# Altium footprint library BMS_Slave.PcbLib: 58 footprints (part 3 of 4)
Each footprint in its own frame and in the unit in brackets; x right, y up, seen from the top. Pads: shape width x height; smd on the part's side, far side on the other; paste and mask are expansions set on the pad; w line width, h text height; cw(c..) or ccw(c..) is an arc to the next point about the centre after c.
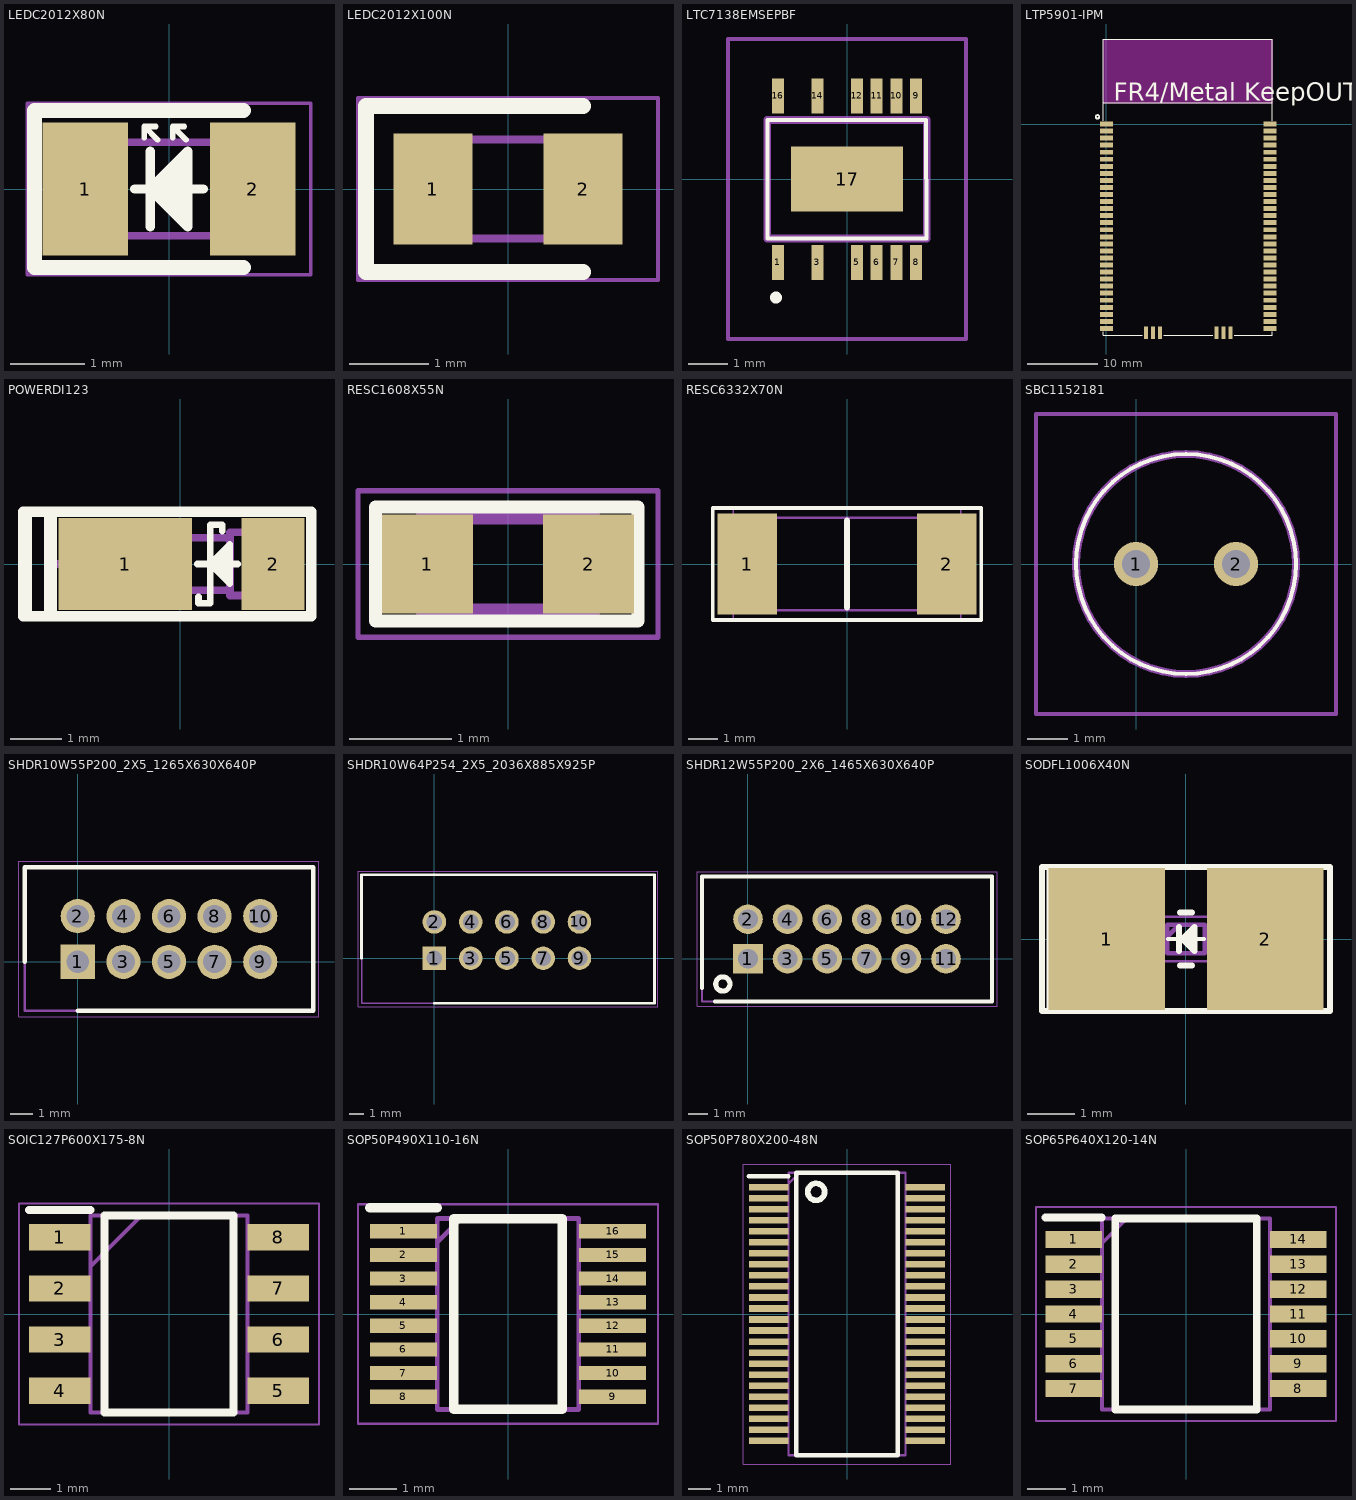
[diagram p2: the footprints below, top view; thin cyan lines are the x and y axes]

## LEDC2012X80N [mil]
pads (2):
  rect 45x70 smd: 1(-44.15,0) 2(44.15,0)
Top Overlay:
  region: -10,0 10,20 10,-20
  lines w3: -13,27 -13,33 ; -7,33 -13,33 ; -6,26 -13,33 ; 2,27 2,33 ; 8,33 2,33 ; 9,26 2,33
  lines w5: -18,0 -10,0 ; -10,-20 -10,20 ; 10,0 18,0 ; -10,0 10,20 10,-20 -10,0
  lines w7.87: 39.37,-41.34 -70.87,-41.34 -70.87,41.34 39.37,41.34
Mechanical 13:
  lines w3.94: -39.37,8.19 -22.95,24.61 ; -39.37,-24.61 39.37,-24.61 39.37,24.61 -39.37,24.61 -39.37,-24.61
Mechanical 15:
  lines w1.97: -74.8,-45.28 74.8,-45.28 74.8,45.28 -74.8,45.28 -74.8,-45.28
3D body "SML-210VTT86.stp": height 31.5, standoff 0, extent -39.37,-24.61 39.37,24.61

## LEDC2012X100N [mm]
pads (2):
  rect 1x1.4 smd: 1(-0.95,0) 2(0.95,0)
Top Overlay:
  lines w0.2: 0.95,-1.05 -1.8,-1.05 -1.8,1.05 0.95,1.05
Mechanical 13:
  lines w0.1: -1,0.208 -0.583,0.625 ; -1,-0.625 -1,0.625 1,0.625 1,-0.625 -1,-0.625
Mechanical 15:
  lines w0.05: -1.9,-1.15 -1.9,1.15 1.9,1.15 1.9,-1.15 -1.9,-1.15

## LTC7138EMSEPBF [mm]
pads (13):
  rect 0.305x0.889 smd: 1(-1.75,-2.107) 3(-0.75,-2.107) 5(0.25,-2.107) 6(0.75,-2.107) 7(1.25,-2.107) 8(1.75,-2.107) 9(1.75,2.107) 10(1.25,2.107) 11(0.75,2.107) 12(0.25,2.107) 14(-0.75,2.107) 16(-1.75,2.107)
  rect 2.845x1.651 smd: 17(0,0)
Top Overlay:
  lines w0.102: -2.02,-1.5 -2.02,1.5 2,1.5 2.02,-1.5 -2.02,-1.5
  lines w0.2: -1.85,-3 cw(c-1.8,-3) -1.75,-3 cw(c-1.8,-3) -1.85,-3
Mechanical 13:
  lines w0.2: -2.02,-1.5 2.02,-1.5 2.02,1.5 -2.02,1.5 -2.02,-1.5
Mechanical 15:
  lines w0.1: -3.02,-4.05 3.02,-4.05 3.02,3.551 -3.02,3.551 -3.02,-4.05
3D body "LTC7138IMSE#PBF.STEP": height 1.1, standoff 0, extent -2.019,-2.45 2.02,2.45

## LTP5901-IPM [mm] "Chip Antenna"
pads (66):
  rect 1.8x0.7 smd mask+0.05: 1(0,0) 2(0,-1) 3(0,-2) 4(0,-3) 5(0,-4) 6(0,-5) 7(0,-6) 8(0,-7) 9(0,-8) 10(0,-9) 11(0,-10) 12(0,-11) 13(0,-12) 14(0,-13) 15(0,-14) 16(0,-15) 17(0,-16) 18(0,-17) 19(0,-18) 20(0,-19) 21(0,-20) 22(0,-21) 23(0,-22) 24(0,-23) 25(0,-24) 26(0,-25) 27(0,-26) 28(0,-27) 29(0,-28) 30(0,-29) 37(23.2,-29) 38(23.2,-28) 39(23.2,-27) 40(23.2,-26) 41(23.2,-25) 42(23.2,-24) 43(23.2,-23) 44(23.2,-22) 45(23.2,-21) 46(23.2,-20) 47(23.2,-19) 48(23.2,-18) 49(23.2,-17) 50(23.2,-16) 51(23.2,-15) 52(23.2,-14) 53(23.2,-13) 54(23.2,-12) 55(23.2,-11) 56(23.2,-10) 57(23.2,-9) 58(23.2,-8) 59(23.2,-7) 60(23.2,-6) 61(23.2,-5) 62(23.2,-4) 63(23.2,-3) 64(23.2,-2) 65(23.2,-1) 66(23.2,0)
  rect 0.6x1.8 smd mask+0.05: 31(5.6,-29.6) 32(6.6,-29.6) 33(7.6,-29.6) 34(15.6,-29.6) 35(16.6,-29.6) 36(17.6,-29.6)
Top Overlay:
  circle w0.254: c-1.27,1.016 r0.254
  lines w0.127: -0.451,-29.5 -0.451,-30 5.1,-30 ; -0.451,0.5 -0.451,12 23.549,12 23.549,0.5 ; -0.451,3 23.549,3 ; 8.1,-30 15.1,-30 ; 18.1,-29.997 23.549,-29.997 23.549,-29.497
  text "FR4/Metal KeepOUT" at 1.016,3.302 h2.54
Keep-Out Layer:
  rectangle: -0.508,2.921 23.622,12.065
3D body "LTP5901_061-0167.STEP": height 3.68, standoff 0.01, extent -0.451,-30 23.549,12

## POWERDI123 [mil]
pads (2):
  rect 102x70 smd: 1(-42,0)
  rect 48x70 smd: 2(71,0)
Top Overlay:
  rectangle: -104,-40 -94,40
  rectangle: -123,-40 -113,40
  region: 38,15 23,0 38,-15
  lines w5: 13,0 23,0 ; 14,-25 14,-30 23,-30 23,30 32,30 32,25 ; 34,0 44,0 ; 23,0 38,-15 38,15 23,0
  lines w7.87: -120,-40 -120,40 100,40 100,-40 -120,-40
Mechanical 13:
  lines w6: -99,0 -69,0 ; -84,-15 -84,15 ; -28,-20 -38,-10 ; -28,20 -38,10 ; -38,-20 -38,-24 -77,-24 -77,24 -38,24 -38,20 ; -38,-20 -38,-10 ; -38,-20 38,-20 ; -38,-10 -38,10 ; -38,-10 -38,10 ; -38,10 -38,20 ; -38,20 38,20 ; 38,-20 38,-24 77,-24 77,25 38,24 38,20 ; 38,-20 38,20
3D body: height 45.28, standoff 0, extent 0,0 0,0
3D body: height 39.37, standoff 0, extent -77,-39 77,39

## RESC1608X55N [mil]
pads (2):
  rect 35x38 smd: 1(-31,0) 2(31,0)
Top Overlay:
  lines w5: -51,-22 -51,22 50,22 50,-22 -51,-22
Mechanical 13:
  lines w5: -33.46,-17.72 -33.46,17.72 33.46,17.72 33.46,-17.72 -33.46,-17.72
Mechanical 15:
  lines w1.97: -57.68,-28.15 -57.68,28.15 57.68,28.15 57.68,-28.15 -57.68,-28.15
3D body "CRCW060310K0FKEAC.STEP": height 21.65, standoff 0, extent -31.49,-15.74 31.5,15.75

## RESC6332X70N [mil]
pads (2):
  rect 80x135 smd: 1(-133.5,0) 2(133.5,0)
Top Overlay:
  lines w5: -180,-75 180,-75 180,75 -180,75 -180,-75
  lines w7.87: 0,-58.07 0,58.07
Mechanical 13:
  lines w3.94: -124.02,-62.01 -124.02,62.01 124.02,62.01 124.02,-62.01 -124.02,-62.01
Mechanical 15:
  lines w1.97: -152.56,-76.77 -152.56,76.77 152.56,76.77 152.56,-76.77 -152.56,-76.77
3D body "CRCW251233R0FKEG.stp": height 27.56, standoff 0, extent -124.02,-62.01 124.02,62.01

## SBC1152181 [mm]
pads (2):
  round 1.1 hole 0.7: 1(0,0) 2(2.5,0)
Top Overlay:
  lines w0.1: -1.5,0 ccw(c1.25,0) 4,0 ccw(c1.25,0) -1.5,0
Mechanical 13:
  lines w0.2: -1.5,0 ccw(c1.25,0) 4,0 ccw(c1.25,0) -1.5,0
Mechanical 15:
  lines w0.1: -2.5,-3.75 -2.5,3.75 5,3.75 5,-3.75 -2.5,-3.75

## SHDR10W55P200_2X5_1265X630X640P [mm]
pads (10):
  rect 1.5x1.5 hole 1: 1(0,0)
  round 1.5 hole 1: 2(0,2) 3(2,0) 4(2,2) 5(4,0) 6(4,2) 7(6,0) 8(6,2) 9(8,0) 10(8,2)
Top Overlay:
  lines w0.2: -2.325,0 -2.325,4.15 10.325,4.15 10.325,-2.15 0,-2.15
Mechanical 13:
  lines w0.1: -2.325,-2.15 -2.325,4.15 10.325,4.15 10.325,-2.15 -2.325,-2.15
Mechanical 15:
  lines w0.05: -2.575,-2.4 -2.575,4.4 10.575,4.4 10.575,-2.4 -2.575,-2.4
3D body "87831-1020.stp": height 6.27, standoff -2.63, extent -2.325,-2.1 10.325,4.2

## SHDR10W64P254_2X5_2036X885X925P [mm]
pads (10):
  rect 1.65x1.65 hole 1.1: 1(0,0)
  round 1.65 hole 1.1: 2(0,2.54) 3(2.54,0) 4(2.54,2.54) 5(5.08,0) 6(5.08,2.54) 7(7.62,0) 8(7.62,2.54) 9(10.16,0) 10(10.16,2.54)
Top Overlay:
  lines w0.2: -5.1,0 -5.1,5.845 15.41,5.845 15.41,-3.155 0,-3.155
Mechanical 13:
  lines w0.1: -5.1,-3.155 -5.1,5.845 15.41,5.845 15.41,-3.155 -5.1,-3.155
Mechanical 15:
  lines w0.05: -5.35,-3.405 -5.35,6.095 15.66,6.095 15.66,-3.405 -5.35,-3.405
3D body "61201021621.STEP": height 9.1, standoff -3, extent -5.1,-3.155 15.26,5.945

## SHDR12W55P200_2X6_1465X630X640P [mm]
pads (12):
  rect 1.5x1.5 hole 1: 1(0,0)
  round 1.5 hole 1: 2(0,2) 3(2,0) 4(2,2) 5(4,0) 6(4,2) 7(6,0) 8(6,2) 9(8,0) 10(8,2) 11(10,0) 12(10,2)
Top Overlay:
  circle w0.254: c-1.27,-1.27 r0.359
  lines w0.2: -2.325,-1.485 -2.325,4.15 12.325,4.15 12.325,-2.15 -1.66,-2.15
Mechanical 13:
  lines w0.1: -2.325,-2.15 12.325,-2.15 12.325,4.15 -2.325,4.15 -2.325,-2.15
Mechanical 15:
  lines w0.05: -2.575,-2.4 12.575,-2.4 12.575,4.4 -2.575,4.4 -2.575,-2.4
3D body "878311220.stp": height 6.4, standoff -2.5, extent -2.286,-2.159 12.364,4.141

## SODFL1006X40N [mm]
pads (2):
  rect 2.464x3 smd: 1(-1.68,0) 2(1.68,0)
Top Overlay:
  region: -0.076,0 0.178,0.254 0.178,-0.254
  lines w0.076: -2.921,-1.524 -2.921,1.524 ; -0.381,0 0,0 0.381,0
  lines w0.127: -0.152,-0.254 -0.152,0.254 ; -0.127,-0.559 0.127,-0.559 ; -0.127,0.559 0.127,0.559 ; -3.048,-1.524 -3.048,1.524 3.048,1.524 3.048,-1.524 -3.048,-1.524 ; -0.076,0 0.178,-0.254 0.178,0.254 -0.076,0
Mechanical 13:
  lines w0.1: -0.4,0.045 -0.145,0.3 ; -0.4,-0.3 -0.4,0.3 0.4,0.3 0.4,-0.3 -0.4,-0.3
Mechanical 15:
  lines w0.05: -0.905,-0.475 -0.905,0.475 0.905,0.475 0.905,-0.475 -0.905,-0.475
3D body "SZESD9101P2T5G.stp": height 0.4, standoff 0, extent -0.5,-0.3 0.5,0.3

## SOIC127P600X175-8N [mm]
pads (8):
  rect 1.525x0.65 smd: 1(-2.712,1.905) 2(-2.712,0.635) 3(-2.712,-0.635) 4(-2.712,-1.905) 5(2.712,-1.905) 6(2.712,-0.635) 7(2.712,0.635) 8(2.712,1.905)
Top Overlay:
  lines w0.2: -3.475,2.58 -1.95,2.58 ; -1.6,-2.45 -1.6,2.45 1.6,2.45 1.6,-2.45 -1.6,-2.45
Mechanical 13:
  lines w0.1: -1.95,1.18 -0.68,2.45 ; -1.95,-2.45 -1.95,2.45 1.95,2.45 1.95,-2.45 -1.95,-2.45
Mechanical 15:
  lines w0.05: -3.725,-2.75 -3.725,2.75 3.725,2.75 3.725,-2.75 -3.725,-2.75
3D body "NE555DR.stp": height 1.75, standoff 0, extent -3,-2.45 3,2.45

## SOP50P490X110-16N [mm]
pads (16):
  rect 1.425x0.3 smd: 1(-2.212,1.75) 2(-2.212,1.25) 3(-2.212,0.75) 4(-2.212,0.25) 5(-2.212,-0.25) 6(-2.212,-0.75) 7(-2.212,-1.25) 8(-2.212,-1.75) 9(2.212,-1.75) 10(2.212,-1.25) 11(2.212,-0.75) 12(2.212,-0.25) 13(2.212,0.25) 14(2.212,0.75) 15(2.212,1.25) 16(2.212,1.75)
Top Overlay:
  lines w0.2: -2.925,2.25 -1.5,2.25 ; -1.15,-2.02 -1.15,2.02 1.15,2.02 1.15,-2.02 -1.15,-2.02
Mechanical 13:
  lines w0.1: -1.5,1.52 -1,2.02 ; -1.5,-2.02 -1.5,2.02 1.5,2.02 1.5,-2.02 -1.5,-2.02
Mechanical 15:
  lines w0.05: -3.175,-2.32 -3.175,2.32 3.175,2.32 3.175,-2.32 -3.175,-2.32
3D body "LTC6820HMS#PBF.stp": height 1.1, standoff 0, extent -2.45,-2.02 2.45,2.02

## SOP50P780X200-48N [mm]
pads (48):
  rect 1.8x0.3 smd: 1(-3.55,5.75) 2(-3.55,5.25) 3(-3.55,4.75) 4(-3.55,4.25) 5(-3.55,3.75) 6(-3.55,3.25) 7(-3.55,2.75) 8(-3.55,2.25) 9(-3.55,1.75) 10(-3.55,1.25) 11(-3.55,0.75) 12(-3.55,0.25) 13(-3.55,-0.25) 14(-3.55,-0.75) 15(-3.55,-1.25) 16(-3.55,-1.75) 17(-3.55,-2.25) 18(-3.55,-2.75) 19(-3.55,-3.25) 20(-3.55,-3.75) 21(-3.55,-4.25) 22(-3.55,-4.75) 23(-3.55,-5.25) 24(-3.55,-5.75) 25(3.55,-5.75) 26(3.55,-5.25) 27(3.55,-4.75) 28(3.55,-4.25) 29(3.55,-3.75) 30(3.55,-3.25) 31(3.55,-2.75) 32(3.55,-2.25) 33(3.55,-1.75) 34(3.55,-1.25) 35(3.55,-0.75) 36(3.55,-0.25) 37(3.55,0.25) 38(3.55,0.75) 39(3.55,1.25) 40(3.55,1.75) 41(3.55,2.25) 42(3.55,2.75) 43(3.55,3.25) 44(3.55,3.75) 45(3.55,4.25) 46(3.55,4.75) 47(3.55,5.25) 48(3.55,5.75)
Top Overlay:
  circle w0.254: c-1.397,5.537 r0.384
  lines w0.2: -4.45,6.25 -2.65,6.25 ; -2.3,-6.4 -2.3,6.4 2.3,6.4 2.3,-6.4 -2.3,-6.4
Mechanical 13:
  lines w0.1: -2.65,5.9 -2.15,6.4 ; -2.65,-6.4 -2.65,6.4 2.65,6.4 2.65,-6.4 -2.65,-6.4
Mechanical 15:
  lines w0.05: -4.7,-6.8 -4.7,6.8 4.7,6.8 4.7,-6.8 -4.7,-6.8
3D body "LTC6811-1.stp": height 2, standoff 0, extent -3.9,-6.4 3.9,6.4

## SOP65P640X120-14N [mm]
pads (14):
  rect 1.475x0.45 smd: 1(-2.938,1.95) 2(-2.938,1.3) 3(-2.938,0.65) 4(-2.938,0) 5(-2.938,-0.65) 6(-2.938,-1.3) 7(-2.938,-1.95) 8(2.938,-1.95) 9(2.938,-1.3) 10(2.938,-0.65) 11(2.938,0) 12(2.938,0.65) 13(2.938,1.3) 14(2.938,1.95)
Top Overlay:
  lines w0.2: -3.675,2.525 -2.2,2.525 ; -1.85,-2.5 1.85,-2.5 1.85,2.5 -1.85,2.5 -1.85,-2.5
Mechanical 13:
  lines w0.1: -2.2,1.85 -1.55,2.5 ; -2.2,-2.5 2.2,-2.5 2.2,2.5 -2.2,2.5 -2.2,-2.5
Mechanical 15:
  lines w0.05: -3.925,-2.8 3.925,-2.8 3.925,2.8 -3.925,2.8 -3.925,-2.8
3D body "MCP2221-I_ST.stp": height 1.2, standoff 0, extent -3.2,-2.5 3.2,2.5